# Altium schematic symbol library Electronic Devices_LIB.SchLib: 703 symbols (part 6 of 8)
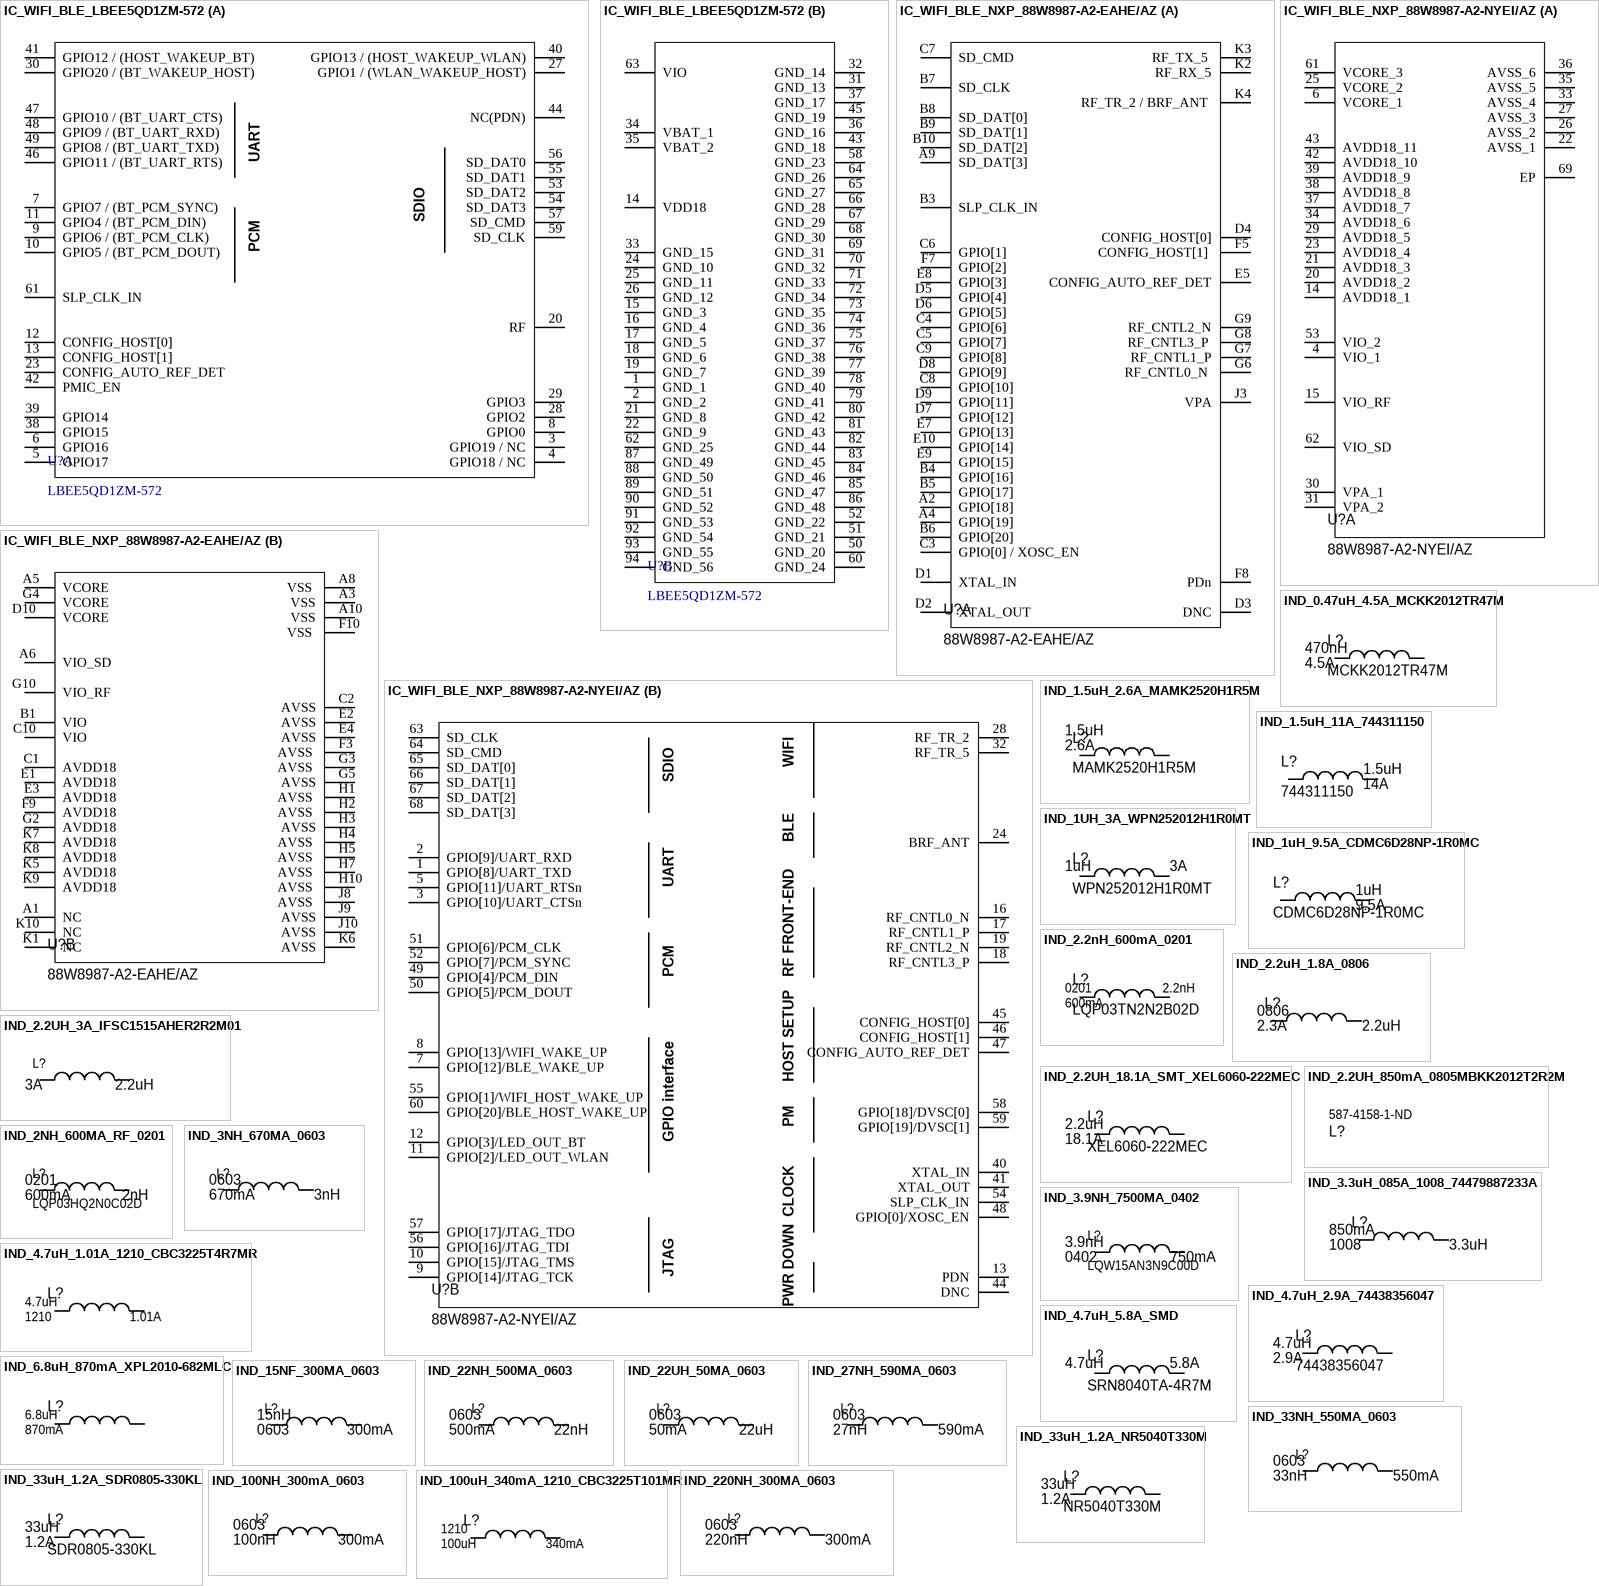
[diagram p41: symbols IC_WIFI_BLE_LBEE5QD1ZM-572 to IND_220NH_300MA_0603]

## IC_WIFI_BLE_NXP_88W8987-A2-EAHE/AZ
designator U?, comment 88W8987-A2-EAHE/AZ
1 x 1 Wi-Fi Dual Band with Bluetooth 5 SoC 802.11ac Wave 2/IEEE 802.11p Transceiver; Manufacturer: NXP Semiconductors; Supplier 1: Avnet; Manufacturer Part Number: 88W8987-A2-EAHE/AZ; RoHS: Yes; Category: RF Receivers, Transceivers; Stock 1: 30000; Pricing 1: 50=7.2358, 60=7.084, 110=6.8816, 250=6.7804, 500=6.6286, 2500=6.4768, 5000=6.2744 (USD); Supplier Part Number 1: 88W8987-A2-EAHE/AZ
footprint IC_WIFI_BGA83C40P10X10_460X420X79 (BGA, 83-Leads, Body 4.60x4.20mmx0.79mm, Pitch 0.40mm)
part A pins: A2 GPIO[18], A4 GPIO[19], A9 SD_DAT[3] , B3 SLP_CLK_IN , B4 GPIO[16], B5 GPIO[17] , B6 GPIO[20] , B7 SD_CLK, B8 SD_DAT[0], B9 SD_DAT[1] , B10 SD_DAT[2] , C3 GPIO[0] / XOSC_EN , C4  GPIO[6] , C5  GPIO[7] , C6 GPIO[1] , C7 SD_CMD, C8 GPIO[10] , C9  GPIO[8] , D1  XTAL_IN , D2  XTAL_OUT, D3 DNC, D4 CONFIG_HOST[0], D5  GPIO[4] , D6  GPIO[5], D7  GPIO[12] , D8 GPIO[9], D9  GPIO[11], E5  CONFIG_AUTO_REF_DET, E7  GPIO[13] , E8  GPIO[3] , E9  GPIO[15] , E10 GPIO[14] , F5  CONFIG_HOST[1] , F7 GPIO[2], F8  PDn, G6 RF_CNTL0_N , G7  RF_CNTL1_P, G8 RF_CNTL3_P , G9  RF_CNTL2_N, J3 VPA, K2 RF_RX_5, K3 RF_TX_5 , K4 RF_TR_2 / BRF_ANT 
part B pins: A1 NC, A3 VSS, A5 VCORE, A6  VIO_SD, A8 VSS , A10 VSS, B1  VIO, C1 AVDD18, C2 AVSS, C10  VIO, D10  VCORE, E1  AVDD18, E2  AVSS, E3 AVDD18, E4 AVSS, F3 AVSS , F9  AVDD18 , F10  VSS , G2 AVDD18, G3  AVSS , G4 VCORE, G5  AVSS, G10  VIO_RF , H1  AVSS , H2 AVSS , H3 AVSS, H4 AVSS , H5  AVSS , H7 AVSS , H10 AVSS , J8 AVSS , J9  AVSS, J10 AVSS, K1 NC, K5 AVDD18 , K6  AVSS, K7 AVDD18, K8 AVDD18 , K9 AVDD18 , K10 NC 

## IC_WIFI_BLE_NXP_88W8987-A2-NYEI/AZ
designator U?, comment 88W8987-A2-NYEI/AZ
PHA88W8987-A2-NYEI/AZ 88W8987-A2-NYEI/AZ; Manufacturer: NXP Semiconductors; Supplier 1: Arrow Electronics; Manufacturer Part Number: 88W8987-A2-NYEI/AZ; RoHS: Yes; Stock 1: 2000; Pricing 1: 2000=7.764 (USD); Supplier Part Number 1: 88W8987-A2-NYEI/AZ
footprint IC_WIFI_BLE_QFN40P800X800X90-69N-D (68-VFQFN Exposed Pad)
part A pins: 4 VIO_1, 6 VCORE_1, 14 AVDD18_1, 15 VIO_RF, 20 AVDD18_2, 21 AVDD18_3, 22 AVSS_1, 23 AVDD18_4, 25 VCORE_2, 26 AVSS_2, 27 AVSS_3, 29 AVDD18_5, 30 VPA_1, 31 VPA_2, 33 AVSS_4, 34 AVDD18_6, 35 AVSS_5, 36 AVSS_6, 37 AVDD18_7, 38 AVDD18_8, 39 AVDD18_9, 42 AVDD18_10, 43 AVDD18_11, 53 VIO_2, 61 VCORE_3, 62 VIO_SD, 69 EP
part B pins: 1 GPIO[8]/UART_TXD, 2 GPIO[9]/UART_RXD, 3 GPIO[10]/UART_CTSn, 5 GPIO[11]/UART_RTSn, 7 GPIO[12]/BLE_WAKE_UP, 8 GPIO[13]/WIFI_WAKE_UP, 9 GPIO[14]/JTAG_TCK, 10 GPIO[15]/JTAG_TMS, 11 GPIO[2]/LED_OUT_WLAN, 12 GPIO[3]/LED_OUT_BT, 13 PDN, 16 RF_CNTL0_N, 17 RF_CNTL1_P, 18 RF_CNTL3_P, 19 RF_CNTL2_N, 24 BRF_ANT, 28 RF_TR_2, 32 RF_TR_5, 40 XTAL_IN, 41 XTAL_OUT, 44 DNC, 45 CONFIG_HOST[0], 46 CONFIG_HOST[1], 47 CONFIG_AUTO_REF_DET, 48 GPIO[0]/XOSC_EN, 49 GPIO[4]/PCM_DIN, 50 GPIO[5]/PCM_DOUT, 51 GPIO[6]/PCM_CLK, 52 GPIO[7]/PCM_SYNC, 54 SLP_CLK_IN, 55 GPIO[1]/WIFI_HOST_WAKE_UP, 56 GPIO[16]/JTAG_TDI, 57 GPIO[17]/JTAG_TDO, 58 GPIO[18]/DVSC[0], 59 GPIO[19]/DVSC[1], 60 GPIO[20]/BLE_HOST_WAKE_UP, 63 SD_CLK, 64 SD_CMD, 65 SD_DAT[0], 66 SD_DAT[1], 67 SD_DAT[2], 68 SD_DAT[3]

## IND_0.47uH_4.5A_MCKK2012TR47M
designator L?, comment MCKK2012TR47M  Current Rating: 4.5A  Inductance: 470nH
Inductor Power Chip Multi-Layer 0.47uH 20% 1MHz Metal 3.1A 0.039Ohm DCR 0805 T/R; Manufacturer: Taiyo Yuden; Shielding: Shielded; DC Resistance (DCR): 39mR; Supplier 1: Digi-Key; Manufacturer Part Number: MCKK2012TR47M; RoHS: Yes; Category: Fixed Inductors; Stock 1: 59761; Pricing 1: 1=0.34, 10=0.279, 25=0.2572, 50=0.2358, 100=0.2079, 250=0.20152, 500=0.18008, 1000=0.14577 (USD); Mount: Surface Mount; Case/Package: 0805; Core Material: Metal; Case Code (Metric): 2012; Min Operating Temperature: -40°C; Max Operating Temperature: 125°C; Packaging: Cut Tape; Tolerance: 20%; Test Frequency: 1MHz; Series: MCOIL™, MC; RoHS Compliant: Yes; ComponentLink1URL: https://ds.yuden.co.jp/TYCOMPAS/ut/detail?pn=MCKK2012TR47M &amp;u=M&src-supplier=Digi-Key; ComponentLink1Description: https://ds.yuden.co.jp/TYCOMPAS/ut/detail?pn=MCKK2012TR47M &amp;u=M&src-supplier=Digi-Key; ComponentLink2URL: http://ds.yuden.co.jp/TYCOMPAS/ut/detail.do?productNo=MCKK2012TR47M&fileName=MCKK2012TR47M_SS&mode=specSheetDownload&src-supplier=Digi-Key; ComponentLink2Description: http://ds.yuden.co.jp/TYCOMPAS/ut/detail.do?productNo=MCKK2012TR47M&fileName=MCKK2012TR47M_SS&mode=specSheetDownload&src-supplier=Digi-Key; ComponentLink3URL: http://ds.yuden.co.jp/TYCOMPAS/ut/detail.do?productNo=MCKK2012TR47M&amp;fileName=MCKK2012TR47M_SS&amp;mode=specSheetDownload&src-supplier=Digi-Key; ComponentLink3Description: http://ds.yuden.co.jp/TYCOMPAS/ut/detail.do?productNo=MCKK2012TR47M&amp;fileName=MCKK2012TR47M_SS&amp;mode=specSheetDownload&src-supplier=Digi-Key; Supplier Part Number 1: 587-5632-1-ND; Case Code (Imperial): 0805
footprint IND_0805_INDC2012X10N (Chip Inductor, 2-Leads, Body 2.00x1.25mm, IPC Medium Density)
pins: 1, 2

## IND_1.5uH_2.6A_MAMK2520H1R5M
designator L?, comment MAMK2520H1R5M  Current Rating: 2.6A  Inductance: 1.5uH
Inductor Power Chip Wirewound 1.5uH 20% 2MHz Metal 2.6A 0.065Ohm DCR 1008 T/R; Manufacturer: Taiyo Yuden; Core Material: Metal,Composite; Saturation Current: 3.7A; Shielding: Unshielded; DC Resistance (DCR): 65mR; Supplier 1: Digikey; Manufacturer Part Number: MAMK2520H1R5M; RoHS: Yes; Category: Fixed Inductors; Stock 1: 8846; Pricing 1: 1=0.23, 10=0.18, 25=0.1628, 50=0.1508, 100=0.1398, 250=0.12644, 500=0.11716, 1000=0.10854, 3000=0.0961, 6000=0.08897, 9000=0.08504, 15000=0.08031, 21000=0.07734, 30000=0.07429, 75000=0.071 (USD); Mount: Surface Mount; Case/Package: 1008; Case Code (Metric): 2520; Case Code (Imperial): 1008; Min Operating Temperature: -40°C; Max Operating Temperature: 125°C; Packaging: Cut Tape; Test Frequency: 2MHz; Tolerance: 20%; Series: MCOIL™,MA-H; Length: 0.098inch; Width: 0.079inch; Height: 1.2mm; Height - Seated (Max): 0.047inch; RoHS Compliant: Yes; ComponentLink1URL: http://www.yuden.co.jp/productdata/catalog/en/wound12_e.pdf?src-supplier=Digikey; ComponentLink1Description: http://www.yuden.co.jp/productdata/catalog/en/wound12_e.pdf?src-supplier=Digikey; ComponentLink2URL: http://ds.yuden.co.jp/TYCOMPAS/ut/detail.do?productNo=MAMK2520H1R5M&fileName=MAMK2520H1R5M_SS&mode=specSheetDownload&src-supplier=Digikey; ComponentLink2Description: http://ds.yuden.co.jp/TYCOMPAS/ut/detail.do?productNo=MAMK2520H1R5M&fileName=MAMK2520H1R5M_SS&mode=specSheetDownload&src-supplier=Digikey; ComponentLink3URL: https://datasheet.octopart.com/MAMK2520H1R5M-Taiyo-Yuden-datasheet-112255110.pdf?src-supplier=Newark; ComponentLink3Description: https://datasheet.octopart.com/MAMK2520H1R5M-Taiyo-Yuden-datasheet-112255110.pdf?src-supplier=Newark; Supplier Part Number 1: 587-4462-1-ND
footprint IND_INDC2520X120N
pins: 1, 2

## IND_1.5uH_11A_744311150
designator L?, comment 744311150  Saturation Current: 14A  Inductance: 1.5uH
Power Choke Shielded Wirewound 1.5uH/1.12uH 20% 100KHz 11A 6.6mOhm DCR T/R; Manufacturer: Wurth Electronics; DC Resistance (DCR): 6.6mR; Self Resonant Frequency: 72MHz; Series Resistance: 6.6R; Supplier 1: Digikey; Manufacturer Part Number: 744311150; RoHS: Yes; Category: Fixed Inductors; Stock 1: 12000; Pricing 1: 1=3.8, 10=3.72, 50=3.44, 100=3.29, 500=3.08 (USD); Mount: Surface Mount; Case/Package: 7040; Number of Pins: 2; Min Operating Temperature: -40°C; Max Operating Temperature: 150°C; Tolerance: 20%; Packaging: Tape and Reel; Shielding: Shielded; Package Quantity: 1; Test Frequency: 100kHz; Max DC Current: 11A; Termination: SMD/SMT; Series: WE-HCI; Inductance Tolerance: 20%; Current Rating: 11A; RMS Current (Irms): 11A; Length: 7mm; Width: 6.9mm; Height: 3.8mm; Height - Seated (Max): 0.157inch; Depth: 7.2mm; Ratings: AEC-Q200; RoHS Compliant: Yes; Lead Free: Lead Free; Reach SVHC Compliant: Unknown; Military Standard: Not; ComponentLink1URL: https://datasheet.ciiva.com/7354/744311150-7354372.pdf?src-supplier=Newark; ComponentLink1Description: https://datasheet.ciiva.com/7354/744311150-7354372.pdf?src-supplier=Newark; ComponentLink2URL: https://datasheet.ciiva.com/7765/1735736-7765005.pdf?src-supplier=Element14; ComponentLink2Description: https://datasheet.ciiva.com/7765/1735736-7765005.pdf?src-supplier=Element14; ComponentLink3URL: https://datasheet.ciiva.com/4954/744311150-54367-4954829.pdf?src-supplier=Mouser; ComponentLink3Description: https://datasheet.ciiva.com/4954/744311150-54367-4954829.pdf?src-supplier=Mouser; ComponentLink4URL: https://datasheet.ciiva.com/11801/0900766b80f886c8-11801798.pdf?src-supplier=Rs; ComponentLink4Description: https://datasheet.ciiva.com/11801/0900766b80f886c8-11801798.pdf?src-supplier=Rs; ComponentLink5URL: https://datasheet.ciiva.com/26307/744311150-eng-tds-26307909.pdf?src-supplier=Distrelec; ComponentLink5Description: https://datasheet.ciiva.com/26307/744311150-eng-tds-26307909.pdf?src-supplier=Distrelec; ComponentLink6URL: https://datasheet.ciiva.com/6692/744311150-6692686.pdf?src-supplier=Digikey; ComponentLink6Description: https://datasheet.ciiva.com/6692/744311150-6692686.pdf?src-supplier=Digikey; ComponentLink7URL: https://datasheet.ciiva.com/6692/744311150-6692685.pdf?src-supplier=Digikey; ComponentLink7Description: https://datasheet.ciiva.com/6692/744311150-6692685.pdf?src-supplier=Digikey; ComponentLink8URL: https://datasheet.ciiva.com/6692/744311150-6692687.pdf?src-supplier=Digikey; ComponentLink8Description: https://datasheet.ciiva.com/6692/744311150-6692687.pdf?src-supplier=Digikey; ComponentLink9URL: https://datasheet.ciiva.com/48691/001087434-da-01-ml-we-hci-smd-hochstromind-744311150-de-en-48691386.pdf?src-supplier=Conrad; ComponentLink9Description: https://datasheet.ciiva.com/48691/001087434-da-01-ml-we-hci-smd-hochstromind-744311150-de-en-48691386.pdf?src-supplier=Conrad; Supplier Part Number 1: 732-1150-1-ND
footprint IND_WE-HCI_7030/7040/705023 (0.276" L x 0.272" W (7.00mm x 6.90mm))
pins: 1, 2

## IND_1UH_3A_WPN252012H1R0MT
designator L?, comment WPN252012H1R0MT  Current Rating: 3A  Inductance: 1uH
Fixed Ind 1.020%UH 0.048 Ohm 4200; Manufacturer: Sunlord; Supplier 1: Digi-Key; Manufacturer Part Number: WPN252012H1R0MT; RoHS: Yes; Category: Fixed Inductors; Stock 1: 17941; Pricing 1: 1=0.39, 10=0.333, 25=0.3056, 50=0.2778, 100=0.2472, 250=0.23332, 500=0.19998, 1000=0.17776 (USD); Supplier Part Number 1: 3442-WPN252012H1R0MTCT-ND
footprint IND_WPN252012H1R0MT (0.098" L x 0.079" W (2.50mm x 2.00mm))
pins: 1, 2

## IND_1uH_9.5A_CDMC6D28NP-1R0MC
designator L?, comment CDMC6D28NP-1R0MC  Inductance: 1uH  Current Rating: 9.5A
Ind Power Shielded Wirewound 1uH 20% 1MHz 10.8A Carrier T/R; Manufacturer: Sumida; Core Material: Metal,Composite; Saturation Current: 8.8A; Max DC Current: 11A; DC Resistance (DCR): 8.8mR; Supplier 1: Digikey; Manufacturer Part Number: CDMC6D28NP-1R0MC; RoHS: Yes; Category: Fixed Inductors; Stock 1: 26268; Pricing 1: 1=0.79, 10=0.666, 25=0.6052, 50=0.569, 100=0.4721, 250=0.4358, 500=0.42624, 1000=0.42625 (USD); Mount: Surface Mount; Case/Package: Nonstandard; Weight: 0.028219oz; Min Operating Temperature: -40°C; Max Operating Temperature: 125°C; Package Quantity: 1; Tolerance: 20%; Shielding: Shielded; Packaging: Tape and Reel; Termination: SMD/SMT; Test Frequency: 1MHz; Series: CDMC6D28; Length: 0.285inch; Width: 0.256inch; Height: 3mm; Height - Seated (Max): 0.118inch; Depth: 6.7mm; Radiation Hardening: No; Lead Free: Lead Free; RoHS Compliant: Yes; ComponentLink1URL: http://www.mouser.com/ds/2/390/CDMC6D28-515389.pdf?src-supplier=Mouser; ComponentLink1Description: http://www.mouser.com/ds/2/390/CDMC6D28-515389.pdf?src-supplier=Mouser; ComponentLink2URL: http://products.sumida.com/products/pdf/CDMC6D28.pdf?src-supplier=Digikey; ComponentLink2Description: http://products.sumida.com/products/pdf/CDMC6D28.pdf?src-supplier=Digikey; ComponentLink3URL: http://www.sumida.com/products/pdf/CDMC6D28.pdf?src-supplier=Avnet; ComponentLink3Description: http://www.sumida.com/products/pdf/CDMC6D28.pdf?src-supplier=Avnet; Supplier Part Number 1: 308-1566-1-ND
footprint IND_SUMIDA_INDPM7265X300N
pins: 1, 2

## IND_2.2nH_600mA_0201
designator L?, comment LQP03TN2N2B02D  Inductance: 2.2nH  Current Rating: 600mA  Case/Package: 0201
Inductor RF Chip Thin Film 2.2nH 0.1nH 500MHz 14Q-Factor 600mA 150mOhm DCR 0201 Paper T/R; Manufacturer: Murata; Core Material: Non-Magnetic; Shielding: Unshielded; Self Resonant Frequency: 11GHz; DC Resistance (DCR): 150mR; Current: 400mA; Q Factor: 14; Supplier 1: Digikey; Manufacturer Part Number: LQP03TN2N2B02D; RoHS: Yes; Category: Fixed Inductors; Stock 1: 77781; Pricing 1: 1=0.1, 10=0.039, 25=0.0372, 50=0.0316, 100=0.0267, 250=0.02548, 500=0.02318, 1000=0.01947, 2500=0.01669 (USD); Mount: Surface Mount; Case Code (Metric): 0603; Case Code (Imperial): 0201; Min Operating Temperature: -55°C; Max Operating Temperature: 125°C; Packaging: Tape and Reel; Package Quantity: 1; Termination: SMD/SMT; Series: LQP; Test Frequency: 500MHz; Max DC Current: 600mA; DC Current: 600mA; Technology: THIN FILM; Length: 0.6mm; Width: 0.012inch; Height: 0.3mm; Height - Seated (Max): 0.013inch; Depth: 0.33mm; Military Standard: Not; Reach SVHC Compliant: No; Lead Free: Lead Free; RoHS Compliant: Yes; ComponentLink1URL: https://datasheet.ciiva.com/4975/product-4975942.pdf?src-supplier=Mouser; ComponentLink1Description: https://datasheet.ciiva.com/4975/product-4975942.pdf?src-supplier=Mouser; Supplier Part Number 1: 490-6723-1-ND
footprint IND_0201_FERRITE_BEAD (0.024" L x 0.012" W (0.60mm x 0.30mm))
pins: 1, 2

## IND_2.2uH_1.8A_0806
designator L?, comment Saturation Current: 2.3A  Inductance: 2.2uH  Case/Package: 0806  (hidden comment: CIGT201610LH2R2MNE)
Inductor Power Thin Film 2.2uH 20% 1MHz Metal 1.8A 0.139Ohm DCR 0806 T/R; Manufacturer: Samsung; Core Material: Metal,Composite; Shielding: Unshielded; DC Resistance (DCR): 139mR; Supplier 1: Digikey; Manufacturer Part Number: CIGT201610LH2R2MNE; RoHS: Yes; Category: Fixed Inductors; Stock 1: 248504; Pricing 1: 1=0.19, 10=0.159, 25=0.146, 50=0.129, 100=0.1128, 250=0.10748, 500=0.10102, 1000=0.07737 (USD); Mount: Surface Mount; Case Code (Imperial): 0806; Case Code (Metric): 2016; Min Operating Temperature: -40°C; Max Operating Temperature: 125°C; Packaging: Cut Tape; Tolerance: 20%; Test Frequency: 1MHz; Series: CIGT; RoHS Compliant: Yes; ComponentLink1URL: https://media.digikey.com/pdf/Data%20Sheets/Samsung%20PDFs/CIGT201610LH2R2MNE_Spec.pdf?src-supplier=Digikey; ComponentLink1Description: https://media.digikey.com/pdf/Data%20Sheets/Samsung%20PDFs/CIGT201610LH2R2MNE_Spec.pdf?src-supplier=Digikey; ComponentLink2URL: http://www.samsungsem.com/kr/support/product-search/inductor/CIGT201610LH2R2MNE.jsp?src-supplier=Digikey; ComponentLink2Description: http://www.samsungsem.com/kr/support/product-search/inductor/CIGT201610LH2R2MNE.jsp?src-supplier=Digikey; Supplier Part Number 1: 1276-6911-1-ND
footprint IND_0806_NDC2016X10N (Chip Inductor, 2-Leads, Body 2.01x1.61mm, IPC Medium Density)
pins: 1, 2

## IND_2.2UH_3A_IFSC1515AHER2R2M01
designator L?, comment Max DC Current: 3A  Inductance: 2.2uH  (hidden comment: IFSC1515AHER2R2M01)
FIXED IND 2.2UH 3A 45 MOHM SMD; Manufacturer: Vishay Dale; Tolerance: 20%; Shielding: Shielded; DC Resistance (DCR): 45mR; Test Frequency: 100kHz; Supplier 1: Digi-Key; RoHS: Yes; Category: Fixed Inductors; Stock 1: 25410; Pricing 1: 1=0.46, 10=0.403, 25=0.3744, 50=0.3166, 100=0.2878, 250=0.27056, 500=0.2418, 1000=0.19574 (USD); Mount: Surface Mount; Case/Package: 1515; Number of Pins: 2; Min Operating Temperature: -55°C; Max Operating Temperature: 125°C; Packaging: Tape and Reel; Package Quantity: 2000; Termination: SMD/SMT; Series: IFSC-1515AH-01; Inductance Tolerance: 20%; Current Rating: 3A; Saturation Current: 3A; RMS Current (Irms): 3A; Length: 0.15inch; Width: 0.15inch; Height: 1.8mm; Height - Seated (Max): 0.075inch; Lead Free: Lead Free; RoHS Compliant: Yes; Reach SVHC Compliant: Unknown; ComponentLink1URL: https://datasheet.ciiva.com/8017/sc15ah01-8017541.pdf?src-supplier=Element14; ComponentLink1Description: https://datasheet.ciiva.com/8017/sc15ah01-8017541.pdf?src-supplier=Element14; ComponentLink2URL: https://datasheet.ciiva.com/22726/1730404-22726056.pdf?src-supplier=Element14; ComponentLink2Description: https://datasheet.ciiva.com/22726/1730404-22726056.pdf?src-supplier=Element14; ComponentLink3URL: https://datasheet.ciiva.com/46395/1913058-46395301.pdf?src-supplier=Element14; ComponentLink3Description: https://datasheet.ciiva.com/46395/1913058-46395301.pdf?src-supplier=Element14; ComponentLink4URL: https://datasheet.ciiva.com/6702/sc15ah01-6702124.pdf?src-supplier=Digi-Key; ComponentLink4Description: https://datasheet.ciiva.com/6702/sc15ah01-6702124.pdf?src-supplier=Digi-Key; ComponentLink5URL: https://datasheet.ciiva.com/6702/sc15ah01-6702123.pdf?src-supplier=Digi-Key; ComponentLink5Description: https://datasheet.ciiva.com/6702/sc15ah01-6702123.pdf?src-supplier=Digi-Key; ComponentLink6URL: https://datasheet.ciiva.com/6702/sc15ah01-6702125.pdf?src-supplier=Digi-Key; ComponentLink6Description: https://datasheet.ciiva.com/6702/sc15ah01-6702125.pdf?src-supplier=Digi-Key; ComponentLink7URL: https://datasheet.ciiva.com/8495/sc15ah01-8495050.pdf?src-supplier=Avnet; ComponentLink7Description: https://datasheet.ciiva.com/8495/sc15ah01-8495050.pdf?src-supplier=Avnet; Supplier Part Number 1: 541-1404-1-ND; Manufacturer Part Number: IFSC1515AHER2R2M01
footprint IND_INDPM4040X190N (0.157" L x 0.157" W (4.00mm x 4.00mm))
pins: 1, 2

## IND_2.2UH_18.1A_SMT_XEL6060-222MEC
designator L?, comment XEL6060-222MEC  Current Rating: 18.1A  Inductance: 2.2uH
Power inductor, shielded, 20% tol, SMT, RoHS, halogen-free; Manufacturer: Coilcraft; Supplier 1: Mouser; Manufacturer Part Number: XEL6060-222MEC; RoHS: Yes; Category: Inductors; Stock 1: 1908; Pricing 1: 1=3.29, 10=3.29, 50=3.29, 100=3.29, 250=2.3, 500=1.6, 1000=1.49, 10000=1.49 (USD); RoHS Compliant: Yes; Supplier Part Number 1: 994-XEL6060-222MEC
footprint IND_XEL6060222MEC (0.258" L x 0.250" W (6.56mm x 6.36mm))
pins: 1, 2

## IND_2.2UH_850mA_0805MBKK2012T2R2M
designator L?, comment Supplier Part Number 1: 587-4158-1-ND  (hidden comment: MBKK2012T2R2M)
Inductor Power Chip Wirewound 2.2uH 20% 1MHz Metal 0.85A 0.29Ohm DCR 0805 T/R; Manufacturer: Taiyo Yuden; Core Material: Metal,Composite; Current Rating: 850mA; Saturation Current: 900mA; Shielding: Shielded; DC Resistance (DCR): 290mR; Supplier 1: Digikey; Manufacturer Part Number: MBKK2012T2R2M; RoHS: Yes; Category: Fixed Inductors; Stock 1: 61828; Pricing 1: 1=0.2, 10=0.166, 25=0.1524, 50=0.1346, 100=0.1177, 250=0.11212, 500=0.10538, 1000=0.08072 (USD); Mount: Surface Mount; Case/Package: 0805; Case Code (Metric): 2012; Case Code (Imperial): 0805; Weight: 0.000194oz; Min Operating Temperature: -40°C; Max Operating Temperature: 105°C; Packaging: Tape and Reel; Tolerance: 20%; Inductance: 2.2uH; Test Frequency: 1MHz; Max DC Current: 850mA; Termination: SMD/SMT; Package Quantity: 3000; Series: MCOIL™, MB; Length: 0.079inch; Width: 0.049inch; Height: 1.2mm; Height - Seated (Max): 0.039inch; Depth: 1.25mm; RoHS Compliant: Yes; ComponentLink1URL: http://www.mouser.com/ds/2/396/wound11_e-794592.pdf?src-supplier=Mouser; ComponentLink1Description: http://www.mouser.com/ds/2/396/wound11_e-794592.pdf?src-supplier=Mouser; ComponentLink2URL: http://ds.yuden.co.jp/TYCOMPAS/ut/detail.do?productNo=MBKK2012T2R2M&fileName=MBKK2012T2R2M_SS&mode=specSheetDownload&src-supplier=Digikey; ComponentLink2Description: http://ds.yuden.co.jp/TYCOMPAS/ut/detail.do?productNo=MBKK2012T2R2M&fileName=MBKK2012T2R2M_SS&mode=specSheetDownload&src-supplier=Digikey; ComponentLink3URL: http://www.yuden.co.jp/productdata/catalog/en/wound11_e.pdf?src-supplier=Digikey; ComponentLink3Description: http://www.yuden.co.jp/productdata/catalog/en/wound11_e.pdf?src-supplier=Digikey; ComponentLink4URL: http://www.yuden.co.jp/ut/product/category/inductor/MBKK2012T2R2M.pdf?src-supplier=Avnet; ComponentLink4Description: http://www.yuden.co.jp/ut/product/category/inductor/MBKK2012T2R2M.pdf?src-supplier=Avnet; ComponentLink5URL: http://ds.yuden.co.jp/TYCOMPAS/ut/detail.do?productNo=MBKK2012T2R2M&dataUnit=M&src-supplier=Avnet; ComponentLink5Description: http://ds.yuden.co.jp/TYCOMPAS/ut/detail.do?productNo=MBKK2012T2R2M&dataUnit=M&src-supplier=Avnet; ComponentLink6URL: https://datasheet.octopart.com/MBKK2012T2R2M-Taiyo-Yuden-datasheet-153594131.pdf?src-supplier=Newark; ComponentLink6Description: https://datasheet.octopart.com/MBKK2012T2R2M-Taiyo-Yuden-datasheet-153594131.pdf?src-supplier=Newark; ComponentLink7URL: https://datasheet.octopart.com/MBKK2012T2R2M-Taiyo-Yuden-datasheet-168159152.pdf?src-supplier=Future+Electronics; ComponentLink7Description: https://datasheet.octopart.com/MBKK2012T2R2M-Taiyo-Yuden-datasheet-168159152.pdf?src-supplier=Future+Electronics; ComponentLink8URL: https://datasheet.octopart.com/MBKK2012T2R2M-Taiyo-Yuden-datasheet-154809598.pdf?src-supplier=Master+Electronics; ComponentLink8Description: https://datasheet.octopart.com/MBKK2012T2R2M-Taiyo-Yuden-datasheet-154809598.pdf?src-supplier=Master+Electronics

## IND_2NH_600MA_RF_0201
designator L?, comment LQP03HQ2N0C02D  Inductance: 2nH  Current Rating: 600mA  Case Code (Imperial): 0201
Inductor RF Chip Unshielded Thick Film 0.002uH 2nH 500MHz 20Q-Factor 0.6A 0.12Ohm DCR 0201 T/R; Manufacturer: Murata; Core Material: Non-Magnetic; DC Resistance (DCR): 120mR; Self Resonant Frequency: 9GHz; Supplier 1: Digi-Key; Manufacturer Part Number: LQP03HQ2N0C02D; RoHS: Yes; Category: Fixed Inductors; Stock 1: 16929; Pricing 1: 1=0.15, 10=0.132, 25=0.1172, 50=0.0996, 100=0.0879, 250=0.08056, 500=0.07322, 1000=0.06151, 2500=0.05272 (USD); Mount: Surface Mount; Case/Package: 0201; Case Code (Metric): 0603; Min Operating Temperature: -55°C; Max Operating Temperature: 125°C; Packaging: Cut Tape; Shielding: Unshielded; Test Frequency: 500MHz; Series: LQP03; RoHS Compliant: Yes; ComponentLink1URL: http://search.murata.co.jp/Ceramy/image/img/P02/JELF243C-0021.pdf?src-supplier=Digi-Key; ComponentLink1Description: http://search.murata.co.jp/Ceramy/image/img/P02/JELF243C-0021.pdf?src-supplier=Digi-Key; ComponentLink2URL: https://search.murata.co.jp/Ceramy/image/img/P02/JELF243C-0021.pdf?src-supplier=Digi-Key; ComponentLink2Description: https://search.murata.co.jp/Ceramy/image/img/P02/JELF243C-0021.pdf?src-supplier=Digi-Key; Supplier Part Number 1: 490-13896-1-ND
footprint IND_0201_LQP03HQ2N0C02D (0.024" L x 0.012" W (0.60mm x 0.30mm))
pins: 1, 2

## IND_3.3uH_085A_1008_74479887233A
designator L?, comment Case Package: 1008  Current Rating: 850mA  Inductance: 3.3uH  (hidden comment: 74479887233A)
Multilayer Inductor, 3.3Uh, 0.85A, 1008 Rohs Compliant: Yes; Manufacturer: Wurth Electronics; Supplier 1: Digikey; Manufacturer Part Number: 74479887233A; RoHS: Yes; Category: Fixed Inductors; Stock 1: 3000; Pricing 1: 1=1.19, 10=1.08, 100=0.97, 1000=0.82, 3000=0.78 (USD); Case/Package: SMD/SMT; RoHS Compliant: Yes; ComponentLink1URL: https://datasheet.octopart.com/74479887233A-Wurth-Elektronik-datasheet-166915814.pdf?src-supplier=Newark; ComponentLink1Description: https://datasheet.octopart.com/74479887233A-Wurth-Elektronik-datasheet-166915814.pdf?src-supplier=Newark; Supplier Part Number 1: 732-74479887233ACT-ND
footprint IND_1008 (Chip Inductor, 2-Leads, Body 2.5x2.0x1.1 mm)
pins: 1, 2

## IND_3.9NH_7500MA_0402
designator L?, comment LQW15AN3N9C00D  Inductance: 3.9nH  Current Rating: 750mA  Case/Package: 0402
3.9 nH Unshielded Drum Core, Wirewound Inductor 750 mA 70mOhm Max 0402 (1005 Metric); Manufacturer: Murata; Core Material: Non-Magnetic,Air,Ferrite; Q Factor: 25; Tolerance: 3%; DC Resistance (DCR): 70mR; Self Resonant Frequency: 10GHz; Test Frequency: 100MHz; Current: 200mA; Supplier 1: Digi-Key; Manufacturer Part Number: LQW15AN3N9C00D; RoHS: Yes; Category: Fixed Inductors; Stock 1: 498472; Pricing 1: 1=0.16, 10=0.143, 25=0.1272, 50=0.1082, 100=0.0954, 250=0.08748, 500=0.07954, 1000=0.06681, 2500=0.05727 (USD); Mount: Surface Mount; Weight: 2.8E-05oz; Case Code (Metric): 1005; Case Code (Imperial): 0402; Min Operating Temperature: -55°C; Max Operating Temperature: 125°C; Packaging: Tape and Reel; Package Quantity: 1; Shielding: Unshielded; Max DC Current: 750mA; Termination: SMD/SMT; DC Current: 750mA; Series: LQW15A_00; Rated Current-Max: 750mA; Length: 1mm; Width: 0.02inch; Height: 0.5mm; Height - Seated (Max): 0.024inch; Depth: 0.7mm; Radiation Hardening: No; Military Standard: Not; Lead Free: Lead Free; RoHS Compliant: Yes; ComponentLink1URL: https://datasheet.ciiva.com/11799/0900766b8090d5c4-11799035.pdf?src-supplier=Rs; ComponentLink1Description: https://datasheet.ciiva.com/11799/0900766b8090d5c4-11799035.pdf?src-supplier=Rs; ComponentLink2URL: https://datasheet.ciiva.com/6705/l0075s0080lqw15a-00-6705382.pdf?src-supplier=Digi-Key; ComponentLink2Description: https://datasheet.ciiva.com/6705/l0075s0080lqw15a-00-6705382.pdf?src-supplier=Digi-Key; ComponentLink3URL: https://datasheet.ciiva.com/6705/l0075s0080lqw15a-00-6705381.pdf?src-supplier=Digi-Key; ComponentLink3Description: https://datasheet.ciiva.com/6705/l0075s0080lqw15a-00-6705381.pdf?src-supplier=Digi-Key; ComponentLink4URL: https://datasheet.ciiva.com/6705/l0075s0080lqw15a-00-6705383.pdf?src-supplier=Digi-Key; ComponentLink4Description: https://datasheet.ciiva.com/6705/l0075s0080lqw15a-00-6705383.pdf?src-supplier=Digi-Key; ComponentLink5URL: https://datasheet.ciiva.com/4976/product-4976439.pdf?src-supplier=Mouser; ComponentLink5Description: https://datasheet.ciiva.com/4976/product-4976439.pdf?src-supplier=Mouser; ComponentLink6URL: https://datasheet.ciiva.com/8507/l0075s0080lqw15a-00-8507485.pdf?src-supplier=Avnet; ComponentLink6Description: https://datasheet.ciiva.com/8507/l0075s0080lqw15a-00-8507485.pdf?src-supplier=Avnet; Supplier Part Number 1: 490-6813-1-ND
footprint IND_0402 (0.039" L x 0.024" W (1.00mm x 0.60mm))
pins: 1, 2

## IND_3NH_670MA_0603
designator L?, comment Current Rating: 670mA  Inductance: 3nH  Case/Package: 0603  (hidden comment: LQW18AN3N0C8ZD)
Ind Chip Wirewound 3nH 0.2nH 0603 Paper T/R; Manufacturer: Murata; Core Material: Non-Magnetic; Shielding: Unshielded; DC Resistance (DCR): 170mR; Self Resonant Frequency: 15GHz; Test Frequency: 100MHz; Supplier 1: Digi-Key; Manufacturer Part Number: LQW18AN3N0C8ZD; RoHS: Yes; Category: Fixed Inductors; Stock 1: 4676; Pricing 1: 1=0.27, 10=0.242, 25=0.212, 50=0.1818, 100=0.1666, 250=0.15152, 500=0.1424, 1000=0.10908 (USD); Mount: Surface Mount; Min Operating Temperature: -55°C; Max Operating Temperature: 125°C; Series: LQW18; Ratings: AEC-Q200; RoHS Compliant: Yes; Supplier Part Number 1: 490-15686-1-ND
footprint IND_0603_INDC1608X08N (Chip Inductor, 2-Leads, Body 1.60x0.80mm, IPC Medium Density)
pins: 1, 2
